# Altium footprint library Stargazer PCB.PcbLib: 32 footprints (part 2 of 2)
Each footprint in its own frame and in the unit in brackets; x right, y up, seen from the top. Pads: shape width x height; smd on the part's side, far side on the other; paste and mask are expansions set on the pad; w line width, h text height; cw(c..) or ccw(c..) is an arc to the next point about the centre after c.
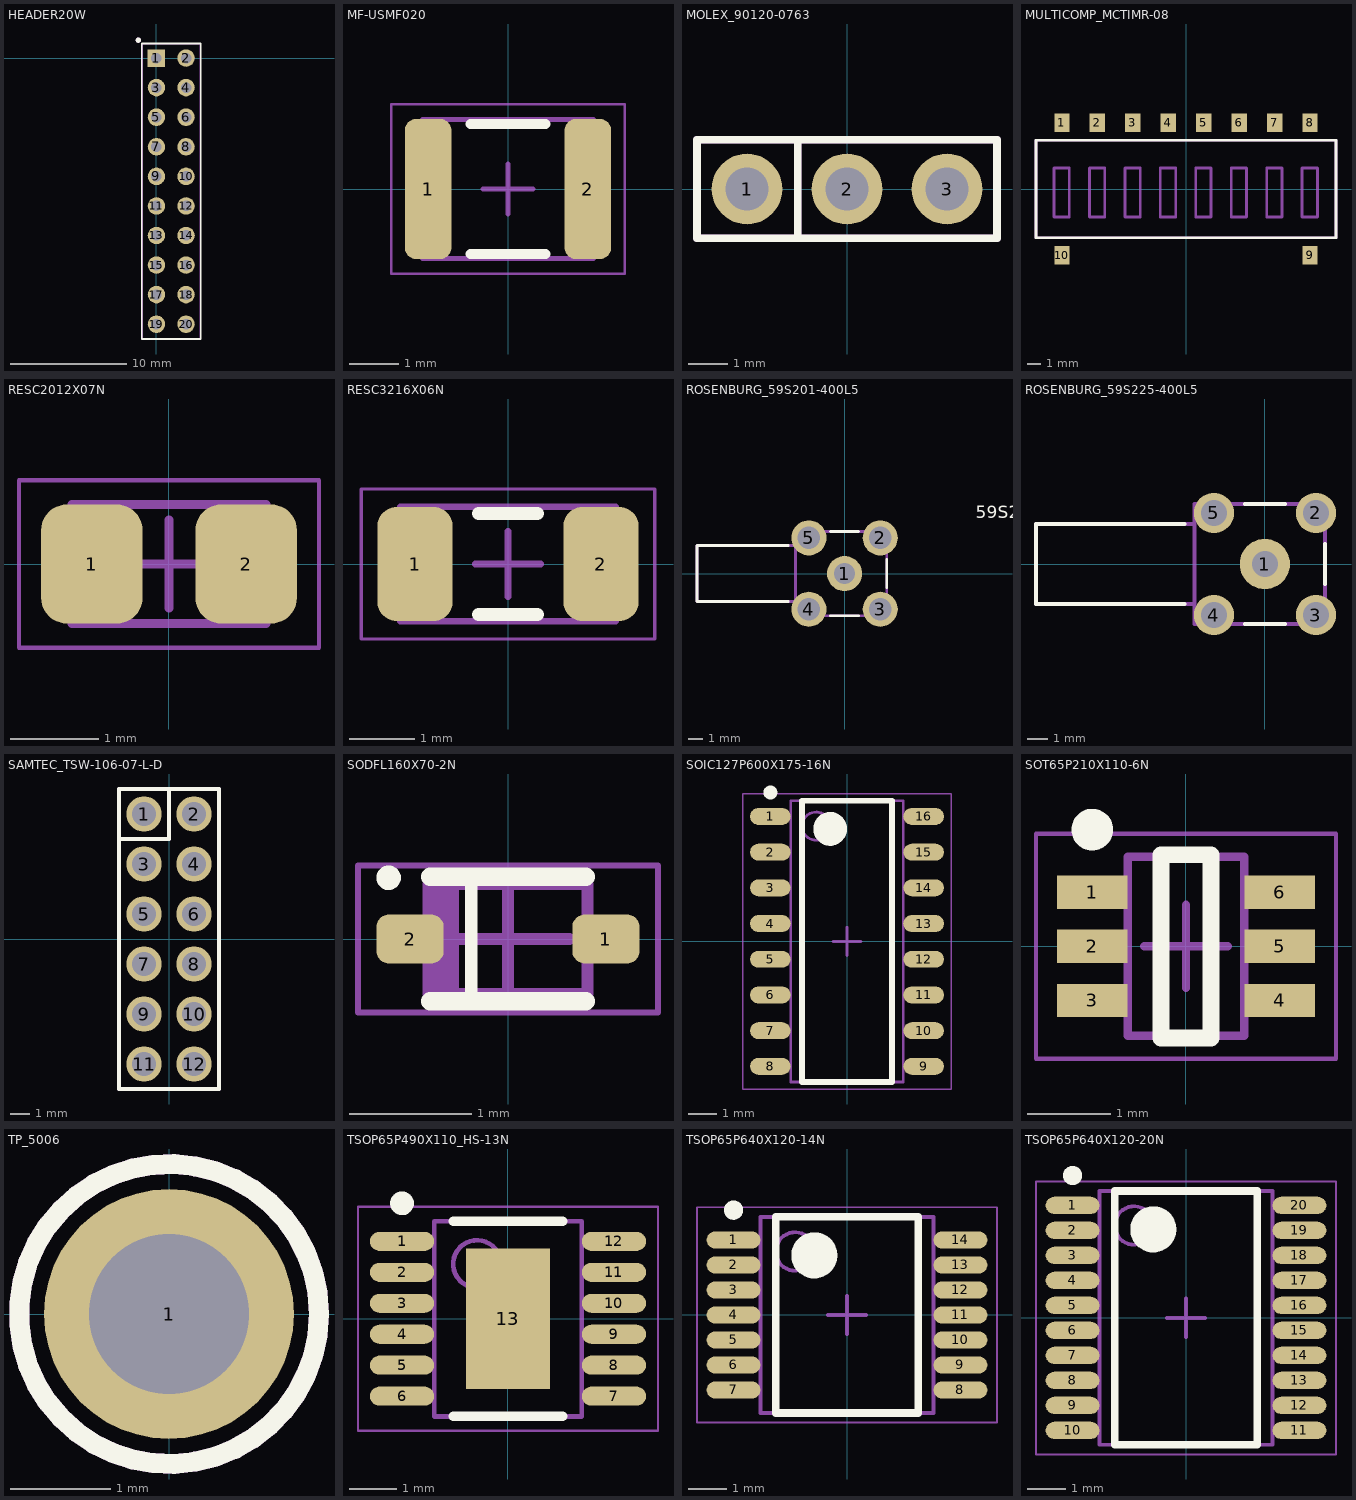
[diagram p1: the footprints below, top view; thin cyan lines are the x and y axes]

## HEADER20W [mm]
pads (20):
  rect 1.5x1.5 hole 0.9: 1(0,0)
  round 1.5 hole 0.9: 2(2.54,0) 3(0,-2.54) 4(2.54,-2.54) 5(0,-5.08) 6(2.54,-5.08) 7(0,-7.62) 8(2.54,-7.62) 9(0,-10.16) 10(2.54,-10.16) 11(0,-12.7) 12(2.54,-12.7) 13(0,-15.24) 14(2.54,-15.24) 15(0,-17.78) 16(2.54,-17.78) 17(0,-20.32) 18(2.54,-20.32) 19(0,-22.86) 20(2.54,-22.86)
Top Overlay:
  circle w0.254: c-1.555,1.535 r0.1
  lines w0.15: -1.271,-24.13 3.809,-24.13 3.809,1.245 -1.271,1.245 -1.271,-24.13
Mechanical 13:
  circle w0.254: c-1.555,1.535 r0.1
  lines w0.15: -1.23,-24.13 3.77,-24.13 3.77,1.235 -1.23,1.235 -1.23,-24.13
  text ".designator" at 0.625,-7.675 h3

## MF-USMF020 [mm] "Chip Fuse, 2-Leads, Body 3.22x2.58mm, IPC Medium Density"
height 1.1
pads (2):
  rrect50% 0.94x2.82 smd: 1(-1.605,0) 2(1.605,0)
Top Overlay:
  lines w0.2: -0.75,-1.31 0.75,-1.31 ; -0.75,1.31 0.75,1.31
Mechanical 13:
  lines w0.1: -1.715,-1.4 1.715,-1.4 1.715,1.4 -1.715,1.4 -1.715,-1.4
  text ".Designator" at -1.397,-0.158 h1.5
Mechanical 15:
  lines w0.05: -2.35,-1.7 2.35,-1.7 2.35,1.7 -2.35,1.7 -2.35,-1.7
  lines w0.1: -0.5,0 0.5,0 ; 0,-0.5 0,0.5
3D body "INDC3226X11N.step": height 1.1, standoff 0, extent -1.715,-1.4 1.715,1.4

## MOLEX_90120-0763 [mm]
pads (3):
  round 1.8 hole 1.1: 1(-2.54,0) 2(0,0) 3(2.54,0)
Top Overlay:
  lines w0.2: -1.25,-1.2 -1.25,1.2 ; -3.81,-1.25 -3.81,1.25 3.81,1.25 3.81,-1.25 -3.81,-1.25
Mechanical 13:
  lines w0.2: -1.25,-1.2 -1.25,1.2 ; -3.81,-1.25 -3.81,1.25 3.81,1.25 3.81,-1.25 -3.81,-1.25
  text ".Designator" at -3.425,-0.277 h2
3D body "901200763.stp": height 9.25, standoff -2.87, extent -3.81,-1.25 3.81,1.25

## MULTICOMP_MCTIMR-08 [mm]
pads (10):
  rect 1.1x1.3 smd: 1(-8.89,4.75) 2(-6.35,4.75) 3(-3.81,4.75) 4(-1.27,4.75) 5(1.27,4.75) 6(3.81,4.75) 7(6.35,4.75) 8(8.89,4.75) 9(8.89,-4.75) 10(-8.89,-4.75)
Top Overlay:
  lines w0.2: -10.75,-3.5 10.75,-3.5 10.75,3.5 -10.75,3.5 -10.75,-3.5
Mechanical 13:
  lines w0.2: -10.75,-3.5 -10.75,3.5 10.75,3.5 10.75,-3.5 -10.75,-3.5 ; -9.46,-2 -9.46,1.5 -8.36,1.5 -8.36,-2 -9.46,-2 ; -6.92,-2 -6.92,1.5 -5.82,1.5 -5.82,-2 -6.92,-2 ; -4.38,-2 -4.38,1.5 -3.28,1.5 -3.28,-2 -4.38,-2 ; -1.84,-2 -1.84,1.5 -0.74,1.5 -0.74,-2 -1.84,-2 ; 0.7,-2 0.7,1.5 1.8,1.5 1.8,-2 0.7,-2 ; 3.24,-2 3.24,1.5 4.34,1.5 4.34,-2 3.24,-2 ; 5.78,-2 5.78,1.5 6.88,1.5 6.88,-2 5.78,-2 ; 8.32,-2 8.32,1.5 9.42,1.5 9.42,-2 8.32,-2
  text ".Designator" at -6.37,1.947 h3
3D body: height 3.7, standoff 0, extent -10.75,-3.5 10.75,3.5

## RESC2012X07N [mm] "Chip Resistor, 2-Leads, Body 2.00x1.25mm, IPC Medium Density"
height 0.7
pads (2):
  rrect50% 1.15x1.35 smd: 1(-0.875,0) 2(0.875,0)
Mechanical 13:
  lines w0.1: -1.1,-0.675 1.1,-0.675 1.1,0.675 -1.1,0.675 -1.1,-0.675
  text ".Designator" at -1.143,-0.158 h1.5
Mechanical 15:
  lines w0.05: -1.7,-0.95 1.7,-0.95 1.7,0.95 -1.7,0.95 -1.7,-0.95
  lines w0.1: -0.5,0 0.5,0 ; 0,-0.5 0,0.5
3D body "RESC2012X07N.step": height 0.7, standoff 0, extent -1.1,-0.675 1.1,0.675

## RESC3216X06N [mm] "Chip Resistor, 2-Leads, Body 3.15x1.60mm, IPC Medium Density"
height 0.6
pads (2):
  rrect50% 1.15x1.75 smd: 1(-1.425,0) 2(1.425,0)
Top Overlay:
  lines w0.2: -0.45,-0.775 0.45,-0.775 ; -0.45,0.775 0.45,0.775
Mechanical 13:
  lines w0.1: -1.65,-0.875 -1.65,0.875 1.65,0.875 1.65,-0.875 -1.65,-0.875
  text ".Designator" at -1.4,-0.151 h1
Mechanical 15:
  lines w0.05: -2.25,-1.15 -2.25,1.15 2.25,1.15 2.25,-1.15 -2.25,-1.15
  lines w0.1: -0.5,0 0.5,0 ; 0,-0.5 0,0.5
3D body "RESC3216X06N.step": height 0.6, standoff 0, extent -1.65,-0.875 1.65,0.875

## ROSENBURG_59S201-400L5 [mm]
pads (5):
  round 2.5 hole 1.5: 1(0,0)
  round 2.5 hole 1.6: 2(2.54,2.54) 3(2.54,-2.54) 4(-2.54,-2.54) 5(-2.54,2.54)
Top Overlay:
  lines w0.2: -4,-2 -10.5,-2 -10.5,2 -4,2 ; -1,-3 1,-3 ; -1,3 1,3 ; 3,-1 3,1
  text "59S201-400L5" at 9.325,3.625 h1.52
Mechanical 13:
  lines w0.2: -3.5,-2 -10.5,-2 -10.5,0 -10.5,2 -3.5,2 ; -3.5,3 -3.5,-3 3,-3 3,3 -3.475,3
  text ".Designator" at -7.975,-0.177 h2
3D body "59s212-400xx_shrink_asm.stp": height 8.75, standoff -3.95, extent -10.5,-3 3,3

## ROSENBURG_59S225-400L5 [mm]
pads (5):
  round 2.5 hole 1.3: 1(0,0)
  round 2 hole 1.3: 2(2.54,2.54) 3(2.54,-2.54) 4(-2.54,-2.54) 5(-2.54,2.54)
Top Overlay:
  lines w0.2: -4,-2 -11.4,-2 -11.4,2 -4,2 ; -1,-3 1,-3 ; -1,3 1,3 ; 3,-1 3,1
Mechanical 13:
  lines w0.2: -3.5,-2 -11.4,-2 -11.4,-0.9 -11.4,2 -3.5,2 ; -3.5,3 -3.5,-3 3,-3 3,3 -3.475,3
  text ".Designator" at -7.975,-0.177 h2
3D body "59s225-400xx_shrink_asm.stp": height 8.3, standoff -3.1, extent -11.4,-3 3.1,3

## SAMTEC_TSW-106-07-L-D [mm]
pads (12):
  round 1.8 hole 1.2: 1(-1.27,6.35) 2(1.27,6.35) 3(-1.27,3.81) 4(1.27,3.81) 5(-1.27,1.27) 6(1.27,1.27) 7(-1.27,-1.27) 8(1.27,-1.27) 9(-1.27,-3.81) 10(1.27,-3.81) 11(-1.27,-6.35) 12(1.27,-6.35)
Top Overlay:
  lines w0.2: -2.54,5.08 0,5.08 0,7.62 ; -2.54,-7.62 2.54,-7.62 2.54,7.62 -2.54,7.62 -2.54,-7.62
Mechanical 13:
  lines w0.2: -2.54,5.08 0,5.08 0,7.62 -2.54,7.62 ; -2.54,7.62 2.54,7.62 2.54,-7.62 -2.54,-7.62 -2.54,7.62
  text ".Designator" at -0.447,-5.08 h3
3D body "strip_tsw-106-07-l-d.stp": height 8.38, standoff -2.54, extent -2.54,-7.62 2.54,7.62

## SODFL160X70-2N [mm] "SODFL, 2-Leads, Body 0.80x1.60mm, IPC Medium Density"
height 0.7
pads (2):
  rrect50% 0.55x0.4 smd: 1(0.8,0) 2(-0.8,0)
Top Overlay:
  circle w0.1: c-0.975,0.5 r0.05
  lines w0.1: -0.3,-0.525 -0.3,0.5
  lines w0.15: -0.635,-0.508 0.635,-0.508 ; -0.635,0.508 0.635,0.508
Mechanical 13:
  rectangle: -0.65,-0.5 -0.4,0.45
  lines w0.1: -0.65,-0.45 -0.65,0.45 0.65,0.45 0.65,-0.45 -0.65,-0.45
  text ".Designator" at -1,-0.351 h1
Mechanical 15:
  lines w0.05: -1.225,-0.6 -1.225,0.6 1.225,0.6 1.225,-0.6 -1.225,-0.6
  lines w0.1: -0.5,0 0.5,0 ; 0,-0.5 0,0.5
3D body "SODFL160X70-2N.step": height 0.7, standoff 0, extent -0.8,-0.45 0.8,0.45

## SOIC127P600X175-16N [mm] "SOIC, 16-Leads, Body 9.90x3.90mm, Pitch 1.27mm, IPC Medium Density"
height 1.75
pads (16):
  oval 1.45x0.6 smd: 1(-2.725,4.445) 2(-2.725,3.175) 3(-2.725,1.905) 4(-2.725,0.635) 5(-2.725,-0.635) 6(-2.725,-1.905) 7(-2.725,-3.175) 8(-2.725,-4.445) 9(2.725,-4.445) 10(2.725,-3.175) 11(2.725,-1.905) 12(2.725,-0.635) 13(2.725,0.635) 14(2.725,1.905) 15(2.725,3.175) 16(2.725,4.445)
Top Overlay:
  circle w0.6: c-0.6,4 r0.3
  circle w0.25: c-2.725,5.295 r0.125
  lines w0.2: -1.6,-5 1.6,-5 1.6,5 -1.6,5 -1.6,-5
Mechanical 13:
  circle w0.1: c-1.1,4.1 r0.5
  lines w0.1: -2,-5 2,-5 2,5 -2,5 -2,-5
  text ".Designator" at 0.402,-3.45 h2
Mechanical 15:
  lines w0.05: -3.7,-5.25 3.7,-5.25 3.7,5.25 -3.7,5.25 -3.7,-5.25
  lines w0.1: -0.5,0 0.5,0 ; 0,-0.5 0,0.5
3D body "SOIC127P600X175-16N.step": height 1.75, standoff 0, extent -3,-5 3,5

## SOT65P210X110-6N [mm] "SOT23, 6-Leads, Body 2.00x2.10mm, Pitch 0.65mm, IPC Medium Density"
height 1.1
pads (6):
  rect 0.85x0.4 smd: 1(-1.125,0.65) 2(-1.125,0) 3(-1.125,-0.65) 4(1.125,-0.65) 5(1.125,0) 6(1.125,0.65)
Top Overlay:
  circle w0.25: c-1.125,1.4 r0.125
  lines w0.2: -0.3,-1.1 0.3,-1.1 0.3,1.1 -0.3,1.1 -0.3,-1.1
Mechanical 13:
  lines w0.1: -0.7,-1.075 -0.7,1.075 0.7,1.075 0.7,-1.075 -0.7,-1.075
  text ".Designator" at -1.905,-0.285 h1.5
Mechanical 15:
  lines w0.05: -1.8,-1.35 -1.8,1.35 1.8,1.35 1.8,-1.35 -1.8,-1.35
  lines w0.1: -0.5,0 0.5,0 ; 0,-0.5 0,0.5
3D body "SOT65P210X110-6N.step": height 1.1, standoff 0, extent -1.2,-1.075 1.2,1.075

## TP_5006 [mm]
height 1.75
pads (1):
  round 2.5 hole 1.6 paste-2539.97: 1(0,0)
Top Overlay:
  circle w0.2: c0,0 r1.5
Mechanical 13:
  circle w0.2: c0,0 r1.5
  text ".Designator" at -3.048,-0.285 h1.5
3D body "5006.step": height 5.58, standoff -3.3, extent -1.576,-1.587 1.576,1.587

## TSOP65P490X110_HS-13N [mm] "TSOP, 12-Leads, Body 4.04x3.00mm, Pitch 0.65mm, Thermal Pad 2.95x1.76mm, IPC Medium Density"
height 1.1
pads (13):
  oval 1.35x0.4 smd mask+0.05: 1(-2.225,1.625) 2(-2.225,0.975) 3(-2.225,0.325) 4(-2.225,-0.325) 5(-2.225,-0.975) 6(-2.225,-1.625) 7(2.225,-1.625) 8(2.225,-0.975) 9(2.225,-0.325) 10(2.225,0.325) 11(2.225,0.975) 12(2.225,1.625)
  rect 1.76x2.95 smd: 13(0,0)
Top Overlay:
  circle w0.25: c-2.225,2.425 r0.125
  lines w0.2: -1.15,-2.05 1.15,-2.05 ; -1.15,2.05 1.15,2.05
Mechanical 13:
  circle w0.1: c-0.65,1.15 r0.5
  lines w0.1: -1.55,-2.05 -1.55,2.05 1.55,2.05 1.55,-2.05 -1.55,-2.05
  text ".Designator" at 0.852,-1.8 h1.5
Mechanical 15:
  lines w0.05: -3.15,-2.35 -3.15,2.35 3.15,2.35 3.15,-2.35 -3.15,-2.35
  lines w0.1: -0.5,0 0.5,0 ; 0,-0.5 0,0.5
3D body "TSOP65P490X110_HS-13N.step": height 1.1, standoff 0, extent -2.449,-2.05 2.449,2.05

## TSOP65P640X120-14N [mm] "TSOP, 14-Leads, Body 5.00x4.40mm, Pitch 0.65mm, IPC Medium Density"
height 1.2
pads (14):
  oval 1.4x0.45 smd mask+0.05: 1(-2.95,1.95) 2(-2.95,1.3) 3(-2.95,0.65) 4(-2.95,0) 5(-2.95,-0.65) 6(-2.95,-1.3) 7(-2.95,-1.95) 8(2.95,-1.95) 9(2.95,-1.3) 10(2.95,-0.65) 11(2.95,0) 12(2.95,0.65) 13(2.95,1.3) 14(2.95,1.95)
Top Overlay:
  circle w0.25: c-2.95,2.725 r0.125
  circle w0.6: c-0.85,1.55 r0.3
  lines w0.2: -1.85,-2.55 -1.85,2.55 1.85,2.55 1.85,-2.55 -1.85,-2.55
Mechanical 13:
  circle w0.1: c-1.35,1.65 r0.5
  lines w0.1: -2.25,-2.55 -2.25,2.55 2.25,2.55 2.25,-2.55 -2.25,-2.55
  text ".Designator" at 0.202,-2.975 h2
Mechanical 15:
  lines w0.05: -3.9,-2.8 -3.9,2.8 3.9,2.8 3.9,-2.8 -3.9,-2.8
  lines w0.1: -0.5,0 0.5,0 ; 0,-0.5 0,0.5
3D body "TSOP65P640X120-14N.step": height 1.2, standoff 0, extent -3.2,-2.55 3.2,2.55

## TSOP65P640X120-20N [mm] "TSOP, 20-Leads, Body 6.50x4.40mm, Pitch 0.65mm, IPC Medium Density"
height 1.2
pads (20):
  oval 1.4x0.45 smd mask+0.05: 1(-2.95,2.925) 2(-2.95,2.275) 3(-2.95,1.625) 4(-2.95,0.975) 5(-2.95,0.325) 6(-2.95,-0.325) 7(-2.95,-0.975) 8(-2.95,-1.625) 9(-2.95,-2.275) 10(-2.95,-2.925) 11(2.95,-2.925) 12(2.95,-2.275) 13(2.95,-1.625) 14(2.95,-0.975) 15(2.95,-0.325) 16(2.95,0.325) 17(2.95,0.975) 18(2.95,1.625) 19(2.95,2.275) 20(2.95,2.925)
Top Overlay:
  circle w0.25: c-2.95,3.7 r0.125
  circle w0.6: c-0.85,2.3 r0.3
  lines w0.2: -1.85,-3.3 -1.85,3.3 1.85,3.3 1.85,-3.3 -1.85,-3.3
Mechanical 13:
  circle w0.1: c-1.35,2.4 r0.5
  lines w0.1: -2.25,-3.3 -2.25,3.3 2.25,3.3 2.25,-3.3 -2.25,-3.3
  text ".Designator" at 0.327,-3.475 h1.5
Mechanical 15:
  lines w0.05: -3.9,-3.55 -3.9,3.55 3.9,3.55 3.9,-3.55 -3.9,-3.55
  lines w0.1: -0.5,0 0.5,0 ; 0,-0.5 0,0.5
3D body "TSOP65P640X120-20N.step": height 1.2, standoff 0, extent -3.2,-3.3 3.2,3.3